# Altium footprint library MyLibrarySum.PcbLib: 208 footprints (part 8 of 13)
Each footprint in its own frame and in the unit in brackets; x right, y up, seen from the top. Pads: shape width x height; smd on the part's side, far side on the other; paste and mask are expansions set on the pad; w line width, h text height; cw(c..) or ccw(c..) is an arc to the next point about the centre after c.
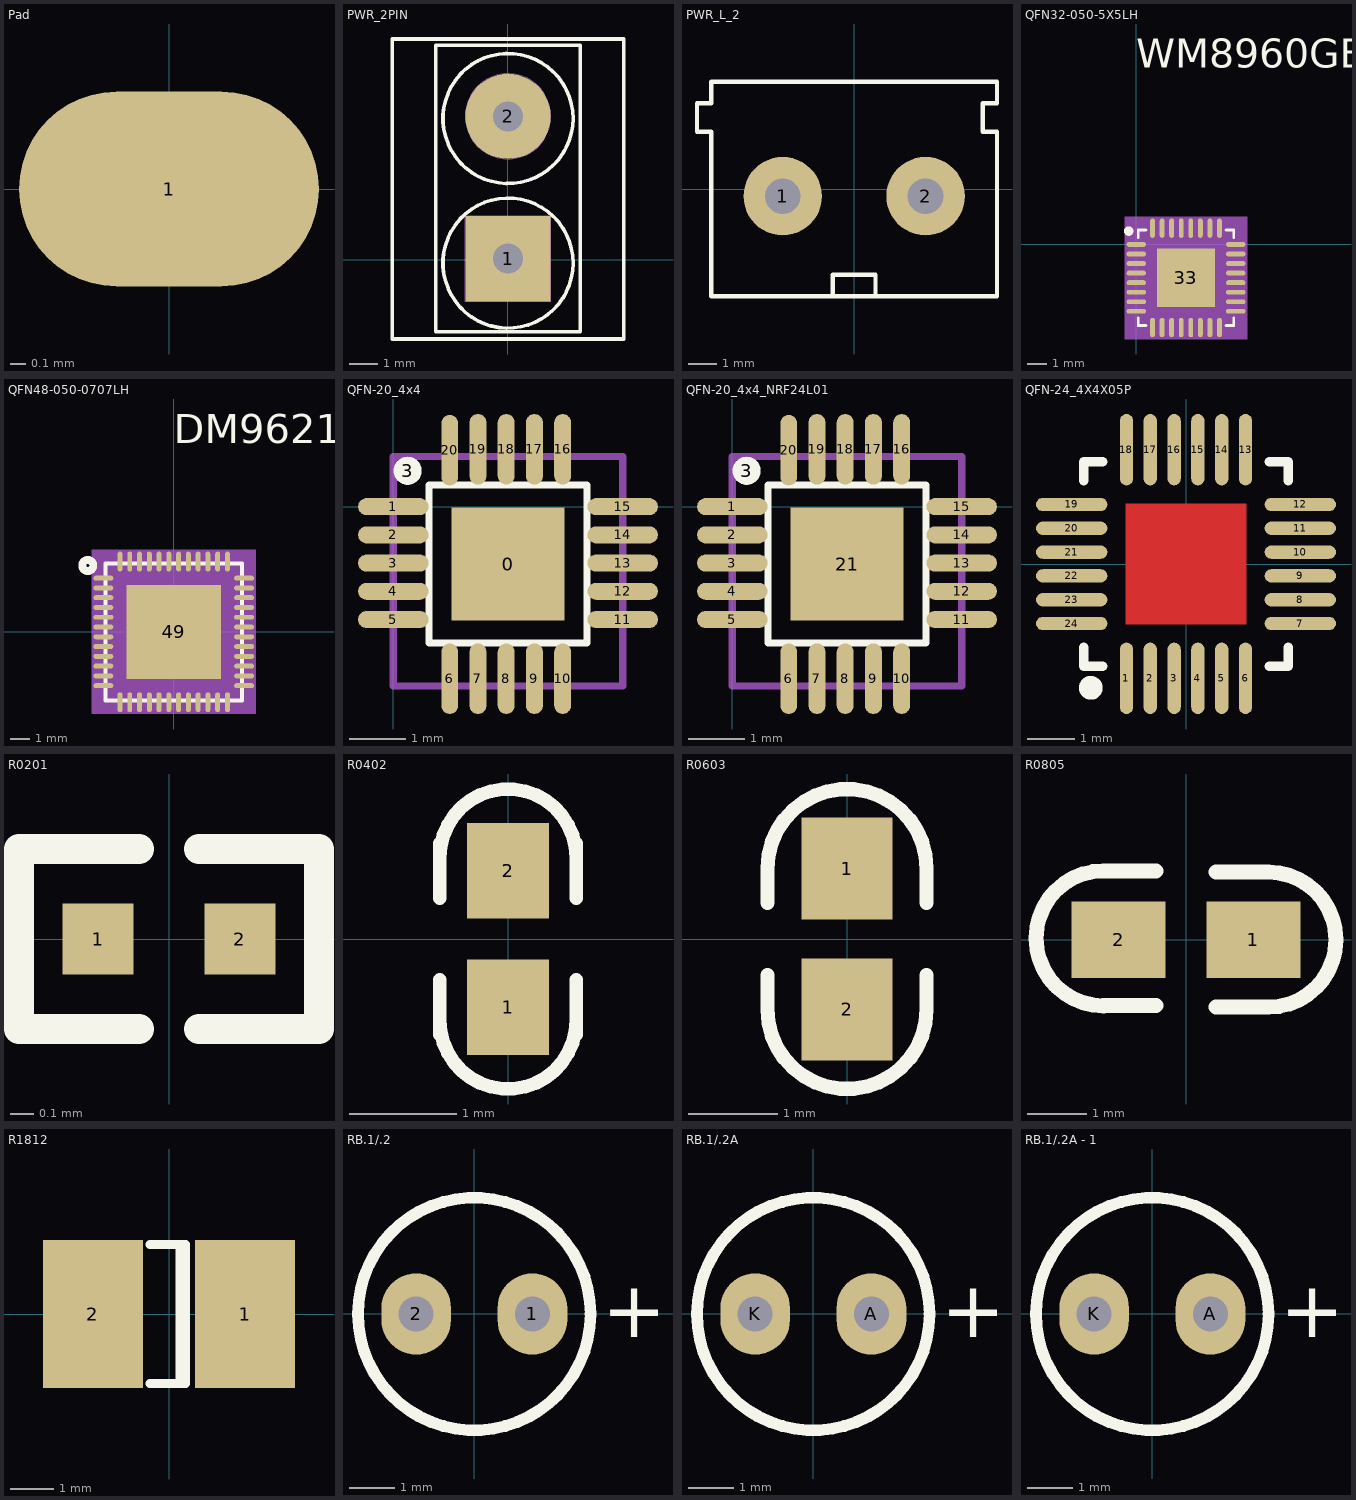
[diagram p7: the footprints below, top view; thin cyan lines are the x and y axes]

## Pad [mm]
pads (1):
  oval 2x1.3 smd: 1(0,0)

## PWR_2PIN [mm]
pads (2):
  rect 3x3 hole 1.05: 1(0.005,0.033)
  round 3 hole 1.05: 2(0.005,5.033)
Top Overlay:
  circle w0.127: c0.005,4.957 r2.286
  circle w0.127: c0.005,-0.123 r2.286
  circle w0.127: c0.005,0.033 r0.525
  lines w0.127: -4.059,-2.79 4.069,-2.79 4.069,7.751 -4.059,7.751 -4.059,-2.79 ; -2.535,-2.536 2.545,-2.536 2.545,7.533 -2.535,7.533 -2.535,-2.536
Mechanical 1:
  circle w0.013: c0.005,5.033 r1.5
  circle w0.013: c0.005,5.033 r0.525
  lines w0.013: -1.495,-1.467 -1.495,1.533 1.505,1.533 1.505,-1.467 -1.495,-1.467

## PWR_L_2 [mil] "5.08-301-2P"
pads (2):
  round 110 hole 50: 1(-100,-10) 2(100,-10)
Top Overlay:
  lines w6: -30,-150 -30,-120 30,-120 30,-150 ; -220,80 -220,120 -200,120 -200,150 200,150 200,120 180,120 180,80 200,80 200,-150 -200,-150 -200,80 -220,80
3D body: height 113.86, standoff -411.73, extent -218,-147.28 229.24,148

## QFN32-050-5X5LH [mil] "QFN32-050-5X5LH"
pads (33):
  oval 40x10 smd: 1(0,0) 2(0,-19.68) 3(0,-39.37) 4(0,-59.05) 5(0,-78.74) 6(0,-98.43) 7(0,-118.11) 8(0,-137.8) 17(204.72,-137.8) 18(204.72,-118.11) 19(204.72,-98.43) 20(204.72,-78.74) 21(204.72,-59.05) 22(204.72,-39.37) 23(204.72,-19.68) 24(204.72,0)
  oval 10x40 smd: 9(33.46,-171.26) 10(53.15,-171.26) 11(72.83,-171.26) 12(92.52,-171.26) 13(112.2,-171.26) 14(131.89,-171.26) 15(151.57,-171.26) 16(171.26,-171.26) 25(171.26,33.46) 26(151.57,33.46) 27(131.89,33.46) 28(112.2,33.46) 29(92.52,33.46) 30(72.83,33.46) 31(53.15,33.46) 32(33.46,33.46)
  rect 120x120 smd: 33(102.36,-68.9)
Top Overlay:
  circle w9.84: c-15.75,27.56 r4.92
  lines w5.98: 3.94,-151.57 3.94,-167.32 19.68,-167.32 ; 3.94,13.78 3.94,29.53 19.68,29.53 ; 185.04,-167.32 200.79,-167.32 200.79,-151.57 ; 185.04,29.53 200.79,29.53 200.79,13.78
  text "WM8960GEFL" at 0,364.17 h59.05
Mechanical 11:
  text "32" at 41.34,46.06 h15.75
  text "15" at 159.45,-158.66 h15.75
  text "4" at 0,-60.63 h15.75
  text "27" at 139.76,46.06 h15.75
  text "1" at 0,-1.57 h15.75
  text "3" at 0,-40.94 h15.75
  text "2" at 0,-21.26 h15.75
  text "5" at 0,-80.31 h15.75
  text "6" at 0,-100 h15.75
  text "7" at 0,-119.68 h15.75
  text "30" at 80.71,46.06 h15.75
  text "10" at 61.02,-158.66 h15.75
  text "8" at 0,-139.37 h15.75
  text "19" at 204.72,-93.7 h15.75
  text "25" at 179.13,46.06 h15.75
  text "29" at 100.39,46.06 h15.75
  text "22" at 204.72,-34.65 h15.75
  text "31" at 61.02,46.06 h15.75
  text "26" at 159.45,46.06 h15.75
  text "21" at 204.72,-54.33 h15.75
  text "23" at 204.72,-14.96 h15.75
  text "13" at 120.08,-158.66 h15.75
  text "17" at 204.72,-133.07 h15.75
  text "18" at 204.72,-113.39 h15.75
  text "28" at 120.08,46.06 h15.75
  text "9" at 41.34,-164.96 h15.75
  text "33" at 52.36,-28.9 h25
  text "24" at 204.72,4.72 h15.75
  text "20" at 204.72,-74.02 h15.75
  text "16" at 179.13,-158.66 h15.75
  text "11" at 80.71,-158.66 h15.75
  text "14" at 139.76,-158.66 h15.75
  text "12" at 100.39,-158.66 h15.75
Mechanical 12:
  circle w9.84: c15.75,17.72 r4.92
  lines w7.87: 3.94,-167.32 200.79,-167.32 200.79,29.53 3.94,29.53 3.94,-167.32
  lines w11.81: 5.91,-137.79 13.78,-137.79 ; 5.91,-118.11 13.78,-118.11 ; 5.91,-98.42 13.78,-98.42 ; 5.91,-78.74 13.78,-78.74 ; 5.91,-59.05 13.78,-59.05 ; 5.91,-39.37 13.78,-39.37 ; 5.91,-19.68 13.78,-19.68 ; 5.91,0 13.78,0 ; 33.46,-165.35 33.46,-157.48 ; 33.46,19.68 33.46,27.56 ; 53.15,-165.35 53.15,-157.48 ; 53.15,19.68 53.15,27.56 ; 72.83,-165.35 72.83,-157.48 ; 72.83,19.68 72.83,27.56 ; 92.52,-165.35 92.52,-157.48 ; 92.52,19.68 92.52,27.56 ; 112.2,-165.35 112.2,-157.48 ; 112.2,19.68 112.2,27.56 ; 131.89,-165.35 131.89,-157.48 ; 131.89,19.68 131.89,27.56 ; 151.57,-165.35 151.57,-157.48 ; 151.57,19.68 151.57,27.56 ; 171.26,-165.35 171.26,-157.48 ; 171.26,19.68 171.26,27.56 ; 190.94,-137.79 198.82,-137.79 ; 190.94,-118.11 198.82,-118.11 ; 190.94,-98.42 198.82,-98.42 ; 190.94,-78.74 198.82,-78.74 ; 190.94,-59.05 198.82,-59.05 ; 190.94,-39.37 198.82,-39.37 ; 190.94,-19.68 198.82,-19.68 ; 190.94,0 198.82,0
  text "pn" at 102.36,-64.17 h15.75
  text "RichardLC" at 102.36,-20.08 h15.75
  text "WM8960GEFL" at 102.36,-13.78 h15.75
  text ".Designator" at 102.36,-57.87 h15.75
Mechanical 13:
  region: -23.62,-194.88 228.35,-194.88 228.35,57.09 -23.62,57.09
Mechanical 16:
  pour cut-out: 1.97,-169.29 202.75,-169.29 202.75,31.5 1.97,31.5
3D body: height 31.5, standoff 0, extent 3.54,-163.9 201.18,33.74

## QFN48-050-0707LH [mil] "QFN48-050-0707LH"
pads (49):
  oval 40x10 smd: 1(-141.73,108.27) 2(-141.73,88.58) 3(-141.73,68.9) 4(-141.73,49.21) 5(-141.73,29.53) 6(-141.73,9.84) 7(-141.73,-9.84) 8(-141.73,-29.53) 9(-141.73,-49.21) 10(-141.73,-68.9) 11(-141.73,-88.58) 12(-141.73,-108.27) 25(141.73,-108.27) 26(141.73,-88.58) 27(141.73,-68.9) 28(141.73,-49.21) 29(141.73,-29.53) 30(141.73,-9.84) 31(141.73,9.84) 32(141.73,29.53) 33(141.73,49.21) 34(141.73,68.9) 35(141.73,88.58) 36(141.73,108.27)
  oval 10x40 smd: 13(-108.27,-141.73) 14(-88.58,-141.73) 15(-68.9,-141.73) 16(-49.21,-141.73) 17(-29.53,-141.73) 18(-9.84,-141.73) 19(9.84,-141.73) 20(29.53,-141.73) 21(49.21,-141.73) 22(68.9,-141.73) 23(88.58,-141.73) 24(108.27,-141.73) 37(108.27,141.73) 38(88.58,141.73) 39(68.9,141.73) 40(49.21,141.73) 41(29.53,141.73) 42(9.84,141.73) 43(-9.84,141.73) 44(-29.53,141.73) 45(-49.21,141.73) 46(-68.9,141.73) 47(-88.58,141.73) 48(-108.27,141.73)
  rect 190x190 smd: 49(0,0)
Top Overlay:
  circle w15.75: c-173.23,133.86 r11.14
  lines w7.87: -137.8,-137.8 137.79,-137.8 137.79,137.79 -137.8,137.79 -137.8,-137.8
  text "DM9621ANP" at 0,379.92 h59.05
Mechanical 11:
  text "12" at -141.73,-103.54 h15.75
  text "2" at -141.73,87.01 h15.75
  text "13" at -100.39,-129.13 h15.75
  text "5" at -141.73,27.95 h15.75
  text "31" at 141.73,14.57 h15.75
  text "4" at -141.73,47.64 h15.75
  text "28" at 141.73,-44.49 h15.75
  text "47" at -80.71,154.33 h15.75
  text "20" at 37.4,-129.13 h15.75
  text "30" at 141.73,-5.12 h15.75
  text "9" at -141.73,-50.79 h15.75
  text "21" at 57.09,-129.13 h15.75
  text "39" at 76.77,154.33 h15.75
  text "8" at -141.73,-31.1 h15.75
  text "29" at 141.73,-24.8 h15.75
  text "34" at 141.73,73.62 h15.75
  text "10" at -141.73,-64.17 h15.75
  text "3" at -141.73,67.32 h15.75
  text "44" at -21.65,154.33 h15.75
  text "22" at 76.77,-129.13 h15.75
  text "32" at 141.73,34.25 h15.75
  text "46" at -61.02,154.33 h15.75
  text "45" at -41.34,154.33 h15.75
  text "42" at 17.72,154.33 h15.75
  text "37" at 116.14,154.33 h15.75
  text "24" at 116.14,-129.13 h15.75
  text "40" at 57.09,154.33 h15.75
  text "41" at 37.4,154.33 h15.75
  text "49" at 0,20 h25
  text "38" at 96.46,154.33 h15.75
  text "43" at -1.97,154.33 h15.75
  text "48" at -100.39,154.33 h15.75
  text "1" at -141.73,106.69 h15.75
  text "6" at -141.73,8.27 h15.75
  text "7" at -141.73,-11.42 h15.75
  text "16" at -41.34,-129.13 h15.75
  text "36" at 141.73,112.99 h15.75
  text "35" at 141.73,93.31 h15.75
  text "33" at 141.73,53.94 h15.75
  text "27" at 141.73,-64.17 h15.75
  text "11" at -141.73,-83.86 h15.75
  text "25" at 141.73,-103.54 h15.75
  text "26" at 141.73,-83.86 h15.75
  text "17" at -21.65,-129.13 h15.75
  text "14" at -80.71,-129.13 h15.75
  text "15" at -61.02,-129.13 h15.75
  text "19" at 17.72,-129.13 h15.75
  text "18" at -1.97,-129.13 h15.75
  text "23" at 96.46,-129.13 h15.75
Mechanical 12:
  circle w9.84: c-125.98,125.98 r4.92
  lines w7.87: -137.8,-137.8 137.79,-137.8 137.79,137.79 -137.8,137.79 -137.8,-137.8
  lines w11.81: -135.83,-108.27 -127.95,-108.27 ; -135.83,-88.58 -127.95,-88.58 ; -135.83,-68.9 -127.95,-68.9 ; -135.83,-49.21 -127.95,-49.21 ; -135.83,-29.53 -127.95,-29.53 ; -135.83,-9.84 -127.95,-9.84 ; -135.83,9.84 -127.95,9.84 ; -135.83,29.53 -127.95,29.53 ; -135.83,49.21 -127.95,49.21 ; -135.83,68.9 -127.95,68.9 ; -135.83,88.58 -127.95,88.58 ; -135.83,108.27 -127.95,108.27 ; -108.27,-135.83 -108.27,-127.95 ; -108.27,127.95 -108.27,135.83 ; -88.58,-135.83 -88.58,-127.95 ; -88.58,127.95 -88.58,135.83 ; -68.9,-135.83 -68.9,-127.95 ; -68.9,127.95 -68.9,135.83 ; -49.21,-135.83 -49.21,-127.95 ; -49.21,127.95 -49.21,135.83 ; -29.53,-135.83 -29.53,-127.95 ; -29.53,127.95 -29.53,135.83 ; -9.84,-135.83 -9.84,-127.95 ; -9.84,127.95 -9.84,135.83 ; 9.84,-135.83 9.84,-127.95 ; 9.84,127.95 9.84,135.83 ; 29.53,-135.83 29.53,-127.95 ; 29.53,127.95 29.53,135.83 ; 49.21,-135.83 49.21,-127.95 ; 49.21,127.95 49.21,135.83 ; 68.9,-135.83 68.9,-127.95 ; 68.9,127.95 68.9,135.83 ; 88.58,-135.83 88.58,-127.95 ; 88.58,127.95 88.58,135.83 ; 108.27,-135.83 108.27,-127.95 ; 108.27,127.95 108.27,135.83 ; 127.95,-108.27 135.83,-108.27 ; 127.95,-88.58 135.83,-88.58 ; 127.95,-68.9 135.83,-68.9 ; 127.95,-49.21 135.83,-49.21 ; 127.95,-29.53 135.83,-29.53 ; 127.95,-9.84 135.83,-9.84 ; 127.95,9.84 135.83,9.84 ; 127.95,29.53 135.83,29.53 ; 127.95,49.21 135.83,49.21 ; 127.95,68.9 135.83,68.9 ; 127.95,88.58 135.83,88.58 ; 127.95,108.27 135.83,108.27
  text "pn" at 0,4.72 h15.75
  text "RichardLC" at 0,48.82 h15.75
  text "DM9621ANP" at 0,48.82 h15.75
  text ".Designator" at 0,4.72 h15.75
Mechanical 13:
  region: -165.35,-165.35 165.35,-165.35 165.35,165.35 -165.35,165.35
Mechanical 16:
  pour cut-out: -139.76,-139.76 139.76,-139.76 139.76,139.76 -139.76,139.76
3D body: height 30.71, standoff -0.79, extent -138.19,-136.38 138.19,140

## QFN-20_4x4 [mm] "QFN, 20-Leads, Body 4.0x4.0mm (max), Pitch 0.50mm, IPC Medium Density"
height 0.85
pads (22):
  rect 2x2 smd: 0(2.032,-1.016)
  oval 1.25x0.3 smd: 1(0,0) 2(0,-0.5) 3(0,-1) 4(0,-1.5) 5(0,-2) 11(4.064,-2) 12(4.064,-1.5) 13(4.064,-1) 14(4.064,-0.5) 15(4.064,0)
  round 0.5 on Top Overlay: 3(0.254,0.635)
  oval 0.3x1.25 smd: 6(1,-3.048) 7(1.5,-3.048) 8(2,-3.048) 9(2.5,-3.048) 10(3,-3.048) 16(3,1.016) 17(2.5,1.016) 18(2,1.016) 19(1.5,1.016) 20(1,1)
Top Overlay:
  lines w0.127: 0.635,-2.413 0.635,0.381 3.429,0.381 3.429,-2.413 0.635,-2.413
Mechanical 1:
  lines w0.127: 0,-3.175 4.064,-3.175 4.064,0.889 0,0.889 0,-3.175
3D body: height 0.62, standoff -0.08, extent 0.532,-2.54 3.532,0.46

## QFN-20_4x4_NRF24L01 [mm] "QFN, 20-Leads, Body 4.0x4.0mm (max), Pitch 0.50mm, IPC Medium Density"
height 0.85
pads (22):
  oval 1.25x0.3 smd: 1(0,0) 2(0,-0.5) 3(0,-1) 4(0,-1.5) 5(0,-2) 11(4.064,-2) 12(4.064,-1.5) 13(4.064,-1) 14(4.064,-0.5) 15(4.064,0)
  round 0.5 on Top Overlay: 3(0.254,0.635)
  oval 0.3x1.25 smd: 6(1,-3.048) 7(1.5,-3.048) 8(2,-3.048) 9(2.5,-3.048) 10(3,-3.048) 16(3,1.016) 17(2.5,1.016) 18(2,1.016) 19(1.5,1.016) 20(1,1)
  rect 2x2 smd: 21(2.032,-1.016)
Top Overlay:
  lines w0.127: 0.635,-2.413 0.635,0.381 3.429,0.381 3.429,-2.413 0.635,-2.413
Mechanical 1:
  lines w0.127: 0,-3.175 4.064,-3.175 4.064,0.889 0,0.889 0,-3.175
3D body: height 0.62, standoff -0.08, extent 0.532,-2.54 3.532,0.46

## QFN-24_4X4X05P [mm]
height 1
pads (24):
  oval 0.28x1.5 smd mask+0.051: 1(-1.25,-2.4) 2(-0.75,-2.4) 3(-0.25,-2.4) 4(0.25,-2.4) 5(0.75,-2.4) 6(1.25,-2.4) 13(1.25,2.4) 14(0.75,2.4) 15(0.25,2.4) 16(-0.25,2.4) 17(-0.75,2.4) 18(-1.25,2.4)
  oval 1.5x0.28 smd mask+0.051: 7(2.4,-1.25) 8(2.4,-0.75) 9(2.4,-0.25) 10(2.4,0.25) 11(2.4,0.75) 12(2.4,1.25) 19(-2.4,1.25) 20(-2.4,0.75) 21(-2.4,0.25) 22(-2.4,-0.25) 23(-2.4,-0.75) 24(-2.4,-1.25)
Top Layer:
  rectangle: -1.27,-1.27 1.27,1.27
Top Overlay:
  circle w0.25: c-2,-2.6 r0.125
  lines w0.2: -2.15,-1.75 -2.15,-2.15 -1.75,-2.15 ; -2.15,1.75 -2.15,2.15 -1.75,2.15 ; 1.75,-2.15 2.15,-2.15 2.15,-1.75 ; 1.75,2.15 2.15,2.15 2.15,1.75
3D body: height 0.9, standoff 0, extent -2.502,-2.502 2.502,2.502

## R0201 [mm]
pads (2):
  rect 0.3x0.3 smd: 1(-0.3,0) 2(0.3,0)
Top Overlay:
  lines w0.127: -0.127,-0.381 -0.635,-0.381 -0.635,0.381 -0.127,0.381 ; 0.127,-0.381 0.635,-0.381 0.635,0.381 0.127,0.381
3D body: height 0.26, standoff 0, extent -0.346,-0.127 0.254,0.173

## R0402 [mil] "SMT电阻"
height 11.81
pads (2):
  rect 30x35 smd: 1(0,-25) 2(0,25)
Top Overlay:
  lines w5: -25,-35 -25,-15 ; -25,-30 ccw(c0,-30) 25,-30 ; -25,15 -25,35 ; -25,30 cw(c0,30) 25,30 ; 25,-35 25,-15 ; 25,15 25,35
3D body: height 14.96, standoff 0, extent -9.84,-19.65 9.84,19.72

## R0603 [mil] "SMT电阻"
height 19.68
pads (2):
  rect 40x45 smd: 1(0,31) 2(0,-31)
Top Overlay:
  lines w6.3: -35,-16 -35,-31 ccw(c0,-31) 35,-31 35,-16 ; -35,16 -35,31 cw(c0,31) 35,31 35,16
3D body: height 19.68, standoff 0, extent -15.35,-31.5 16.14,31.5
3D body: height 0, standoff 0, extent 0,30 0,30
3D body: height 0, standoff 0, extent 0,0 0,0

## R0805 [mm] "SMT电阻"
height 0.6
pads (2):
  rect 1.6x1.3 smd: 1(1.143,0) 2(-1.143,0)
Top Overlay:
  lines w0.254: -1.397,-1.119 cw(c-1.397,0.024) -1.397,1.167 -0.508,1.167 ; -1.397,-1.118 -0.508,-1.118 ; 0.508,-1.142 1.397,-1.142 ; 0.508,1.143 1.397,1.143 cw(c1.397,0) 1.397,-1.143
3D body: height 0.6, standoff 0, extent -1.001,-0.601 0.999,0.599

## R1812 [mm] "SMT电阻"
height 1.1
pads (2):
  rect 2.3x3.4 smd: 1(1.75,0) 2(-1.75,0)
Top Overlay:
  lines w0.2: -0.446,-1.6 0.381,-1.6 0.381,1.6 -0.446,1.6 ; 0.254,-1.6 0.254,1.6
3D body: height 0.7, standoff 0, extent -2.123,-1.651 2.377,1.549

## RB.1/.2 [mil]
pads (2):
  oval 60x70 hole 30: 1(50,0) 2(-50,0)
Top Overlay:
  circle w10: c0,0 r100
  text "+" at 110,-20 h48
3D body: height 216.53, standoff -131.14, extent -100,-40 116.56,58.43

## RB.1/.2A [mil]
pads (2):
  oval 60x70 hole 30: A(50,0) K(-50,0)
Top Overlay:
  circle w10: c0,0 r100
  text "+" at 110,-20 h48
3D body: height 99.43, standoff -236.22, extent -98.85,-502.22 100,22.22

## RB.1/.2A - 1 [mil]
pads (2):
  oval 60x70 hole 30: A(50,0) K(-50,0)
Top Overlay:
  circle w10: c0,0 r100
  text "+" at 110,-20 h48
3D body: height 453.76, standoff -128.81, extent -118.85,-120 80,78.85